# Altium footprint library sun_library.PcbLib: 412 footprints (part 13 of 26)
Each footprint in its own frame and in the unit in brackets; x right, y up, seen from the top. Pads: shape width x height; smd on the part's side, far side on the other; paste and mask are expansions set on the pad; w line width, h text height; cw(c..) or ccw(c..) is an arc to the next point about the centre after c.
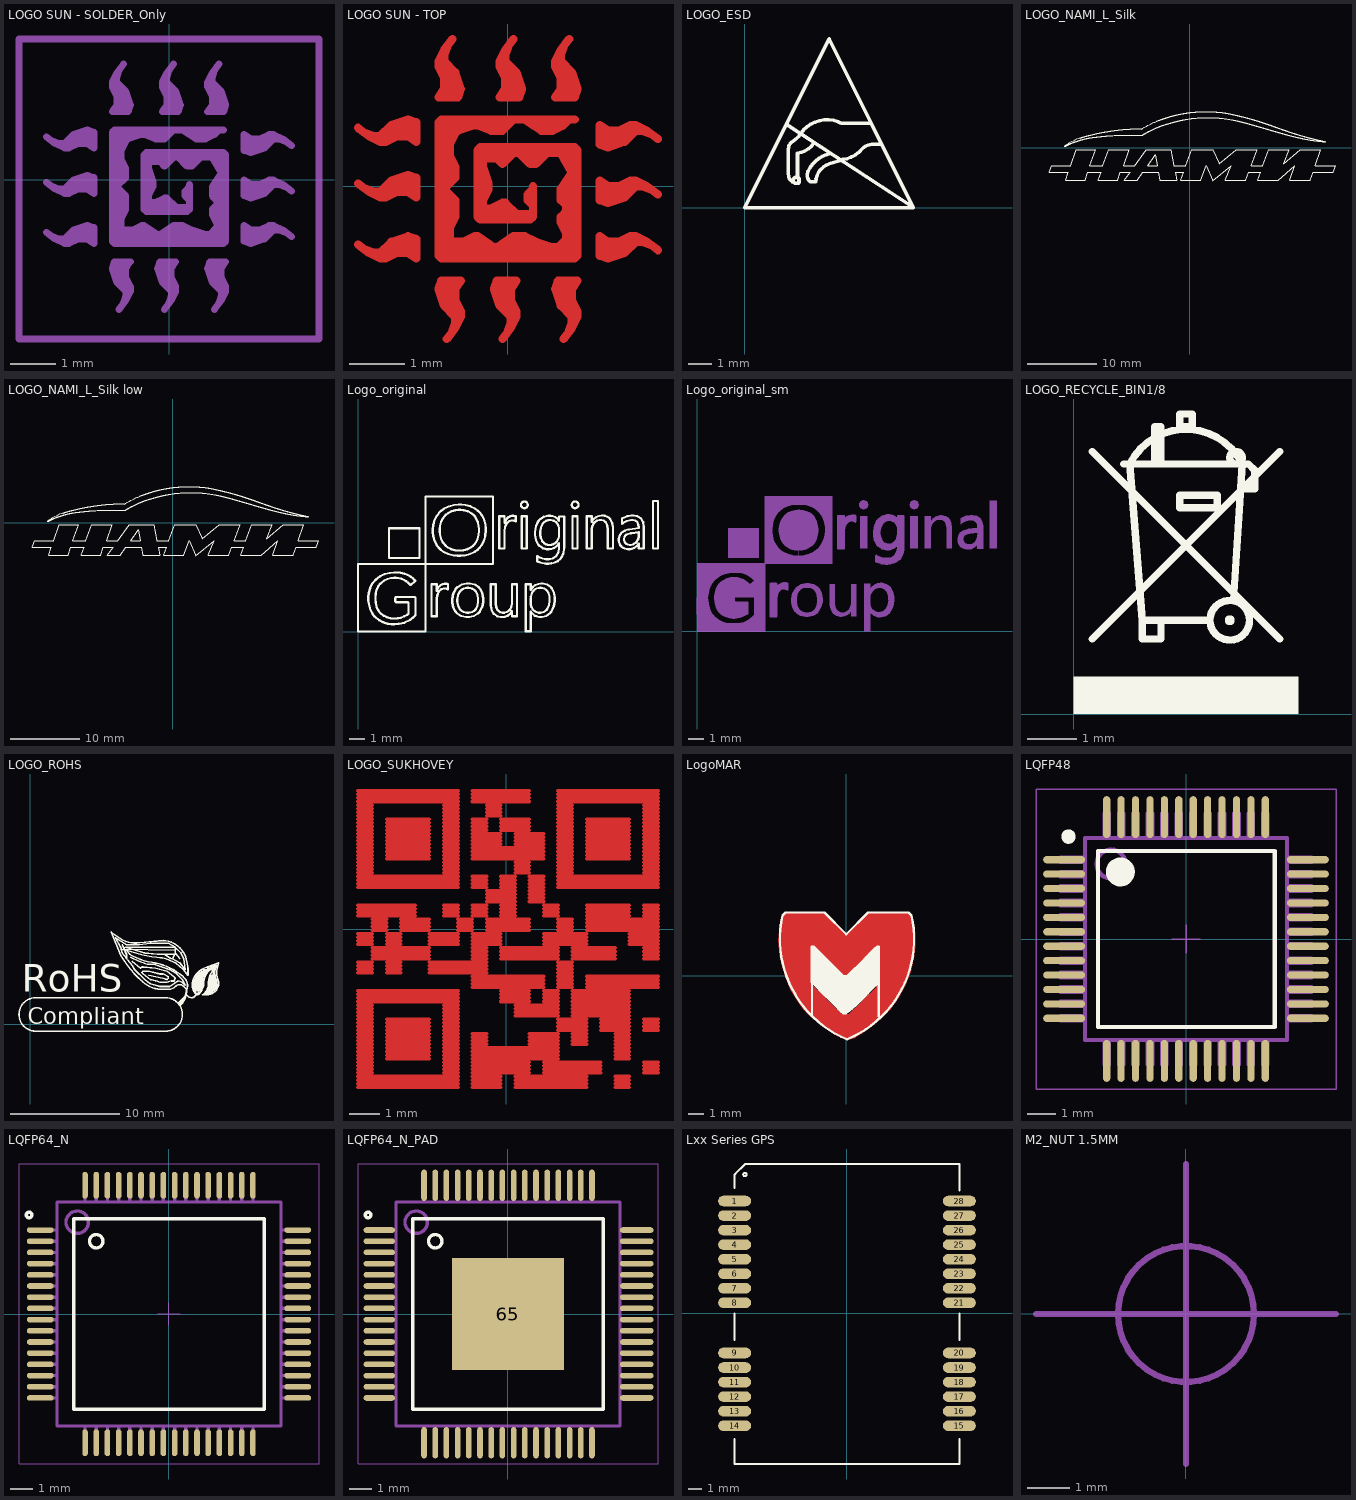
[diagram p12: the footprints below, top view; thin cyan lines are the x and y axes]

## LOGO SUN - SOLDER_Only [mm]
Top Solder:
  drawing of 670 lines, arcs and shapes, not listed

## LOGO SUN - TOP [mm]
Top:
  lines w0.15: -2.5,-1.2 -2.7,-1.05 -2.5,-1.2 ; -2.5,-1.2 -2.3,-1.3 ; -2.5,-1.2 -2.3,-1.3 ; -2.5,-0.1 -2.7,0.05 -2.5,-0.1 ; -2.5,-0.1 -2.3,-0.2 ; -2.5,-0.1 -2.3,-0.2 ; -2.5,0.9 -2.7,1.05 -2.5,0.9 ; -2.5,0.9 -2.3,0.8 ; -2.5,0.9 -2.3,0.8 ; -2.4,-1.2 -2.3,-1.2 ; -2.4,-1.2 -2.55,-1.15 -2.4,-1.2 ; -2.4,-1.2 -2.3,-1.2 ; -2.4,-0.1 -2.3,-0.1 ; -2.4,-0.1 -2.55,-0.05 -2.4,-0.1 ; -2.4,-0.1 -2.3,-0.1 ; -2.4,0.9 -2.3,0.9 ; -2.4,0.9 -2.55,0.95 -2.4,0.9 ; -2.4,0.9 -2.3,0.9 ; -2.3,-1.3 -2.2,-1.3 ; -2.3,-1.3 -2.2,-1.3 ; -2.3,-1.2 -2.1,-1 ; -2.3,-1.2 -2.1,-1 ; -2.3,-1.2 -2.15,-1.2 ; -2.3,-1.2 -2.15,-1.2 ; -2.3,-0.2 -2.2,-0.2 ; -2.3,-0.2 -2.2,-0.2 ; -2.3,-0.1 -2.15,-0.1 ; -2.3,-0.1 -2.1,0.1 ; -2.3,-0.1 -2.1,0.1 ; -2.3,-0.1 -2.15,-0.1 ; -2.3,0.8 -2.2,0.8 ; -2.3,0.8 -2.2,0.8 ; -2.3,0.9 -2.1,1.1 ; -2.3,0.9 -2.1,1.1 ; -2.3,0.9 -2.15,0.9 ; -2.3,0.9 -2.15,0.9 ; -2.2,-1.3 -2,-1.2 ; -2.2,-1.3 -2,-1.2 ; -2.2,-0.2 -2,-0.1 ; -2.2,-0.2 -2,-0.1 ; -2.2,0.8 -2,0.9 ; -2.2,0.8 -2,0.9 ; -2.15,-1.2 -2,-1.1 ; -2.15,-1.2 -2,-1.1 ; -2.15,-0.1 -2,0 ; -2.15,-0.1 -2,0 ; -2.15,0.9 -2,1 ; -2.15,0.9 -2,1 ; -2.1,-1 -1.8,-0.9 ; -2.1,-1 -1.8,-0.9 ; -2.1,0.1 -1.8,0.2 ; -2.1,0.1 -1.8,0.2 ; -2.1,1.1 -1.8,1.2 ; -2.1,1.1 -1.8,1.2 ; -2.05,-1.05 -1.9,-1.025 -2.05,-1.05 ; -2.05,-1.05 -2.2,-1.2 -2.05,-1.05 ; -2.05,0.05 -2.2,-0.1 -2.05,0.05 ; -2.05,0.05 -1.9,0.075 -2.05,0.05 ; -2.05,1.05 -2.2,0.9 -2.05,1.05 ; -2.05,1.05 -1.9,1.075 -2.05,1.05 ; -2,-1.2 -1.8,-1.2 ; -2,-1.2 -1.8,-1.2 ; -2,-1.1 -1.8,-1.1 ; -2,-1.1 -1.8,-1.1 ; -2,-0.1 -1.8,-0.1 ; -2,-0.1 -1.8,-0.1 ; -2,0 -1.8,0 ; -2,0 -1.8,0 ; -2,0.9 -1.8,0.9 ; -2,0.9 -1.8,0.9 ; -2,1 -1.8,1 ; -2,1 -1.8,1 ; -1.8,-1.2 -1.65,-1.3 ; -1.8,-1.2 -1.65,-1.3 ; -1.8,-1.1 -1.75,-1.2 ; -1.8,-1.1 -1.75,-1.2 ; -1.8,-0.9 -1.65,-0.95 ; -1.8,-0.9 -1.65,-0.95 ; -1.8,-0.1 -1.65,-0.2 ; -1.8,-0.1 -1.65,-0.2 ; -1.8,0 -1.75,-0.1 ; -1.8,0 -1.75,-0.1 ; -1.8,0.2 -1.65,0.15 ; -1.8,0.2 -1.65,0.15 ; -1.8,0.9 -1.65,0.8 ; -1.8,0.9 -1.65,0.8 ; -1.8,1 -1.75,0.9 ; -1.8,1 -1.75,0.9 ; -1.8,1.2 -1.65,1.15 ; -1.8,1.2 -1.65,1.15 ; -1.75,-1.2 -1.75,-1 ; -1.75,-1.2 -1.75,-1 ; -1.75,-1 -1.85,-1 -1.75,-1 ; -1.75,-0.1 -1.75,0.1 ; -1.75,-0.1 -1.75,0.1 ; -1.75,0.1 -1.85,0.1 -1.75,0.1 ; -1.75,0.9 -1.75,1.1 ; -1.75,0.9 -1.75,1.1 ; -1.75,1.1 -1.85,1.1 -1.75,1.1 ; -1.65,-1.3 -1.65,-0.95 ; -1.65,-1.3 -1.65,-0.95 ; -1.65,-0.2 -1.65,0.15 ; -1.65,-0.2 -1.65,0.15 ; -1.65,0.8 -1.65,1.15 ; -1.65,0.8 -1.65,1.15 ; -1.25,-1.85 -1.15,-2.15 ; -1.25,-1.85 -1.2,-1.7 ; -1.25,-1.85 -1.2,-1.7 ; -1.25,-1.85 -1.15,-2.15 ; -1.25,-1.25 -1.25,1.15 ; -1.25,-1.25 -1.25,1.15 ; -1.25,-1.25 -1.2,-1.3 ; -1.25,-1.25 -1.2,-1.3 ; -1.25,1.15 -1.2,1.2 ; -1.25,1.15 -1.2,1.2 ; -1.25,1.6 -1.15,1.75 ; -1.25,1.6 -1.15,1.75 ; -1.25,1.6 -0.9,1.6 ; -1.25,1.6 -0.9,1.6 ; -1.25,2.15 -1.25,2.25 ; -1.25,2.15 -1.15,1.95 ; -1.25,2.15 -1.15,1.95 ; -1.25,2.15 -1.25,2.25 ; -1.25,2.25 -1.15,2.45 ; -1.25,2.25 -1.15,2.45 ; -1.2,-1.7 -0.85,-1.7 ; -1.2,-1.7 -0.85,-1.7 ; -1.2,-1.3 1.2,-1.3 ; -1.2,-1.3 1.2,-1.3 ; -1.2,1.2 1.2,1.2 -1.2,1.2 ; -1.15,-2.15 -0.95,-2.35 ; -1.15,-2.15 -0.95,-2.35 ; -1.15,-1.8 -1.15,-1.9 -1.15,-1.8 ; -1.15,-1.8 -0.95,-1.8 ; -1.15,-1.8 -0.95,-1.8 ; -1.15,-1.2 -1.15,1.05 -1.15,-1.2 ; -1.15,-1.2 -1.15,-1.25 -1.15,-1.2 ; -1.15,-0.05 -0.95,-0.25 ; -1.15,-0.05 -0.95,0.15 ; -1.15,-0.05 -0.95,0.15 ; -1.15,-0.05 -0.95,-0.25 ; -1.15,1.7 -1.05,1.75 ; -1.15,1.7 -1.05,1.75 ; -1.15,1.7 -0.95,1.7 ; -1.15,1.7 -0.95,1.7 ; -1.15,1.75 -1.15,1.95 ; -1.15,1.75 -1.15,1.95 ; -1.15,2.1 -1.05,1.95 ; -1.15,2.1 -1.15,2.25 ; -1.15,2.1 -1.15,2.25 ; -1.15,2.1 -1.05,1.95 ; -1.15,2.25 -1.15,2.35 ; -1.15,2.25 -1.15,2.35 ; -1.15,2.25 -0.95,2.05 ; -1.15,2.25 -0.95,2.05 ; -1.15,2.35 -1.1,2.5 -1.15,2.35 ; -1.15,2.45 -1,2.65 -1.15,2.45 ; -1.1,-2.1 -1.125,-1.95 -1.1,-2.1 ; -1.1,-2.1 -0.95,-2.25 -1.1,-2.1 ; -1.05,-2.05 -1.05,-1.85 ; -1.05,-2.05 -1.05,-1.85 ; -1.05,-2.05 -0.95,-2.2 ; -1.05,-2.05 -0.95,-2.2 ; -1.05,-1.85 -0.95,-1.8 ; -1.05,-1.85 -0.95,-1.8 ; -1.05,1.75 -1.05,1.95 ; -1.05,1.75 -1.05,1.95 ; -1,-1 -0.8,-1 ; -1,-1 -0.8,-1 ; -1,-1 -1.1,-1 -1,-1 ; -1,2 -1.15,2.15 -1,2 ; -1,2 -0.975,1.85 -1,2 ; -0.95,-2.55 -0.85,-2.35 ; -0.95,-2.55 -0.85,-2.35 ; -0.95,-2.55 -1.1,-2.75 -0.95,-2.55 ; -0.95,-2.45 -1,-2.6 -0.95,-2.45 ; -0.95,-2.45 -0.95,-2.35 ; -0.95,-2.45 -0.95,-2.35 ; -0.95,-2.35 -0.95,-2.2 ; -0.95,-2.35 -0.95,-2.2 ; -0.95,-2.05 -0.85,-2.25 ; -0.95,-2.05 -0.85,-2.25 ; -0.95,-2.05 -0.95,-1.85 ; -0.95,-2.05 -0.95,-1.85 ; -0.95,-1.85 -0.85,-1.7 ; -0.95,-1.85 -0.85,-1.7 ; -0.95,-0.55 -1.05,-0.75 -0.95,-0.55 ; -0.95,-0.55 -0.95,-0.25 ; -0.95,-0.55 -0.95,-0.25 ; -0.95,0.15 -0.95,0.35 ; -0.95,0.15 -0.95,0.35 ; -0.95,0.35 -1.05,0.55 -0.95,0.35 ; -0.95,1.7 -0.95,1.8 -0.95,1.7 ; -0.95,2.05 -0.85,1.75 ; -0.95,2.05 -0.85,1.75 ; -0.9,1 -0.6,1.1 -0.9,1 ; -0.9,1 -1,1 -0.9,1 ; -0.9,1.6 -0.85,1.75 ; -0.9,1.6 -0.85,1.75 ; -0.85,-2.35 -0.85,-2.25 ; -0.85,-2.35 -0.85,-2.25 ; -0.8,-1 -0.4,-1 -0.8,-1 ; -0.8,-1 -0.6,-0.9 -0.8,-1 ; -0.55,-0.55 -0.5,-0.6 ; -0.55,-0.55 -0.5,-0.6 ; -0.55,-0.55 -0.55,0.65 ; -0.55,-0.55 -0.55,0.65 ; -0.55,0.65 -0.5,0.7 ; -0.55,0.65 -0.5,0.7 ; -0.5,-0.6 0.4,-0.6 ; -0.5,-0.6 0.4,-0.6 ; -0.5,0.7 1.2,0.7 ; -0.5,0.7 1.2,0.7 ; -0.45,-0.4 -0.3,-0.4 ; -0.45,-0.4 -0.45,-0.25 ; -0.45,-0.4 -0.45,-0.25 ; -0.45,-0.4 -0.3,-0.4 ; -0.45,-0.25 -0.35,-0.05 ; -0.45,-0.25 -0.35,-0.05 ; -0.45,0.35 -0.45,0.5 ; -0.45,0.35 -0.35,0.05 ; -0.45,0.35 -0.35,0.05 ; -0.45,0.35 -0.45,0.5 ; -0.45,0.5 -0.2,0.5 ; -0.45,0.5 -0.2,0.5 ; -0.35,-0.05 -0.35,0.05 ; -0.35,-0.05 -0.35,0.05 ; -0.3,-0.4 0.05,-0.4 -0.3,-0.4 ; -0.3,-0.4 -0.1,-0.3 ; -0.3,-0.4 -0.1,-0.3 ; -0.3,1 -0.55,1.1 -0.3,1 ; -0.3,1 -0.1,1 ; -0.3,1 -0.1,1 ; -0.25,-1.85 -0.15,-2.15 ; -0.25,-1.85 -0.2,-1.7 ; -0.25,-1.85 -0.2,-1.7 ; -0.25,-1.85 -0.15,-2.15 ; -0.2,-1.7 0.15,-1.7 ; -0.2,-1.7 0.15,-1.7 ; -0.2,-1.1 0.1,-0.9 ; -0.2,-1.1 0.1,-0.9 ; -0.2,-1.1 -0.3,-1.1 -0.2,-1.1 ; -0.2,0.5 -0.1,0.4 ; -0.2,0.5 0,0.5 -0.2,0.5 ; -0.2,0.5 -0.1,0.4 ; -0.15,-2.15 0.05,-2.35 ; -0.15,-2.15 0.05,-2.35 ; -0.15,-1.8 -0.15,-1.9 -0.15,-1.8 ; -0.15,-1.8 0.05,-1.8 ; -0.15,-1.8 0.05,-1.8 ; -0.15,1.6 -0.05,1.75 ; -0.15,1.6 0.2,1.6 ; -0.15,1.6 0.2,1.6 ; -0.15,1.6 -0.05,1.75 ; -0.15,2.15 -0.05,1.95 ; -0.15,2.15 -0.15,2.25 ; -0.15,2.15 -0.15,2.25 ; -0.15,2.15 -0.05,1.95 ; -0.15,2.25 -0.05,2.45 ; -0.15,2.25 -0.05,2.45 ; -0.1,-2.1 0.05,-2.25 -0.1,-2.1 ; -0.1,-2.1 -0.125,-1.95 -0.1,-2.1 ; -0.1,-0.3 -0.05,-0.3 ; -0.1,-0.3 -0.05,-0.3 ; -0.1,0.4 0.05,0.55 ; -0.1,0.4 0.05,0.55 ; -0.1,1 0.1,1.2 -0.1,1 ; -0.05,-2.05 0.05,-2.2 ; -0.05,-2.05 -0.05,-1.85 ; -0.05,-2.05 -0.05,-1.85 ; -0.05,-2.05 0.05,-2.2 ; -0.05,-1.85 0.05,-1.8 ; -0.05,-1.85 0.05,-1.8 ; -0.05,-0.3 0.15,-0.5 ; -0.05,-0.3 0.15,-0.5 ; -0.05,1.7 0.05,1.75 ; -0.05,1.7 0.15,1.7 ; -0.05,1.7 0.15,1.7 ; -0.05,1.7 0.05,1.75 ; -0.05,1.75 -0.05,1.95 ; -0.05,1.75 -0.05,1.95 ; -0.05,2.1 -0.05,2.25 ; -0.05,2.1 0.05,1.95 ; -0.05,2.1 0.05,1.95 ; -0.05,2.1 -0.05,2.25 ; -0.05,2.25 -0.05,2.35 ; -0.05,2.25 0.15,2.05 ; -0.05,2.25 0.15,2.05 ; -0.05,2.25 -0.05,2.35 ; -0.05,2.35 0,2.5 -0.05,2.35 ; -0.05,2.45 0.1,2.65 -0.05,2.45 ; 0.05,-2.55 -0.1,-2.75 0.05,-2.55 ; 0.05,-2.55 0.15,-2.35 ; 0.05,-2.55 0.15,-2.35 ; 0.05,-2.45 0.05,-2.35 ; 0.05,-2.45 0,-2.6 0.05,-2.45 ; 0.05,-2.45 0.05,-2.35 ; 0.05,-2.35 0.05,-2.2 ; 0.05,-2.35 0.05,-2.2 ; 0.05,-2.05 0.15,-2.25 ; 0.05,-2.05 0.05,-1.85 ; 0.05,-2.05 0.05,-1.85 ; 0.05,-2.05 0.15,-2.25 ; 0.05,-1.85 0.15,-1.7 ; 0.05,-1.85 0.15,-1.7 ; 0.05,0.55 0.1,0.6 ; 0.05,0.55 0.1,0.6 ; 0.05,1.75 0.05,1.95 ; 0.05,1.75 0.05,1.95 ; 0.1,-0.9 0.3,-0.9 ; 0.1,-0.9 0.3,-0.9 ; 0.1,0.6 0.2,0.6 ; 0.1,0.6 0.2,0.6 ; 0.1,2 -0.05,2.15 0.1,2 ; 0.1,2 0.125,1.85 0.1,2 ; 0.15,-2.35 0.15,-2.25 ; 0.15,-2.35 0.15,-2.25 ; 0.15,-0.5 -0.4,-0.5 0.15,-0.5 ; 0.15,-0.5 0.45,-0.5 0.15,-0.5 ; 0.15,1.7 0.15,1.8 0.15,1.7 ; 0.15,2.05 0.25,1.75 ; 0.15,2.05 0.25,1.75 ; 0.2,0.6 0.4,0.4 ; 0.2,0.6 0.4,0.4 ; 0.2,1.6 0.25,1.75 ; 0.2,1.6 0.25,1.75 ; 0.3,-0.9 0.5,-1 ; 0.3,-0.9 0.5,-1 ; 0.35,-0.25 0.35,-0.15 ; 0.35,-0.25 0.45,-0.35 0.35,-0.25 ; 0.35,-0.25 0.35,-0.15 ; 0.35,-0.15 0.45,-0.05 0.35,-0.15 ; 0.4,-0.6 0.45,-0.55 ; 0.4,-0.6 0.45,-0.55 ; 0.4,0.4 0.5,0.4 ; 0.4,0.4 0.5,0.4 ; 0.45,-0.55 0.45,0 0.45,-0.55 ; 0.5,-1 0.8,-1.1 ; 0.5,-1 -0.05,-1 0.5,-1 ; 0.5,-1 0.8,-1.1 ; 0.5,0.4 0.7,0.6 ; 0.5,0.4 0.7,0.6 ; 0.6,1 0.8,1 ; 0.6,1 0.3,1.2 0.6,1 ; 0.6,1 0.8,1 ; 0.7,0.6 0.95,0.6 ; 0.7,0.6 0.95,0.6 ; 0.8,-1.1 0.9,-1.1 ; 0.8,-1.1 0.9,-1.1 ; 0.8,1 1,1.1 ; 0.8,1 1,1.1 ; 0.85,-1.85 0.95,-2.15 ; 0.85,-1.85 0.9,-1.7 ; 0.85,-1.85 0.9,-1.7 ; 0.85,-1.85 0.95,-2.15 ; 0.85,1.6 1.2,1.6 ; 0.85,1.6 1.2,1.6 ; 0.85,1.6 0.95,1.75 ; 0.85,1.6 0.95,1.75 ; 0.85,2.15 0.95,1.95 ; 0.85,2.15 0.85,2.25 ; 0.85,2.15 0.85,2.25 ; 0.85,2.15 0.95,1.95 ; 0.85,2.25 0.95,2.45 ; 0.85,2.25 0.95,2.45 ; 0.9,-1.7 1.25,-1.7 ; 0.9,-1.7 1.25,-1.7 ; 0.9,-1.1 1.05,-0.95 ; 0.9,-1.1 1.05,-0.95 ; 0.95,-2.15 1.15,-2.35 ; 0.95,-2.15 1.15,-2.35 ; 0.95,-1.8 0.95,-1.9 0.95,-1.8 ; 0.95,-1.8 1.15,-1.8 ; 0.95,-1.8 1.15,-1.8 ; 0.95,-0.65 0.95,-0.55 ; 0.95,-0.65 0.95,-0.55 ; 0.95,-0.65 1.05,-0.85 ; 0.95,-0.65 1.05,-0.85 ; 0.95,-0.55 1.05,-0.45 ; 0.95,-0.55 1.05,-0.45 ; 0.95,-0.25 0.95,-0.05 ; 0.95,-0.25 0.95,-0.05 ; 0.95,-0.25 1.05,-0.35 ; 0.95,-0.25 1.05,-0.35 ; 0.95,-0.05 1.15,0.25 ; 0.95,-0.05 1.15,0.25 ; 0.95,0.6 1.15,0.25 ; 0.95,0.6 1.15,0.25 ; 0.95,1.7 1.05,1.75 ; 0.95,1.7 1.15,1.7 ; 0.95,1.7 1.15,1.7 ; 0.95,1.7 1.05,1.75 ; 0.95,1.75 0.95,1.95 ; 0.95,1.75 0.95,1.95 ; 0.95,2.1 0.95,2.25 ; 0.95,2.1 0.95,2.25 ; 0.95,2.1 1.05,1.95 ; 0.95,2.1 1.05,1.95 ; 0.95,2.25 0.95,2.35 ; 0.95,2.25 0.95,2.35 ; 0.95,2.25 1.15,2.05 ; 0.95,2.25 1.15,2.05 ; 0.95,2.35 1,2.5 0.95,2.35 ; 0.95,2.45 1.1,2.65 0.95,2.45 ; 1,-2.1 0.975,-1.95 1,-2.1 ; 1,-2.1 1.15,-2.25 1,-2.1 ; 1,1.1 0.45,1.1 1,1.1 ; 1,1.1 1.1,1.2 1,1.1 ; 1.05,-2.05 1.15,-2.2 ; 1.05,-2.05 1.05,-1.85 ; 1.05,-2.05 1.05,-1.85 ; 1.05,-2.05 1.15,-2.2 ; 1.05,-1.85 1.15,-1.8 ; 1.05,-1.85 1.15,-1.8 ; 1.05,-0.95 1.05,-0.85 ; 1.05,-0.95 1.05,-0.85 ; 1.05,-0.45 1.05,-0.35 ; 1.05,-0.45 1.05,-0.35 ; 1.05,1.75 1.05,1.95 ; 1.05,1.75 1.05,1.95 ; 1.1,2 0.95,2.15 1.1,2 ; 1.1,2 1.125,1.85 1.1,2 ; 1.15,-2.55 1.25,-2.35 ; 1.15,-2.55 1.25,-2.35 ; 1.15,-2.55 1,-2.75 1.15,-2.55 ; 1.15,-2.45 1.15,-2.35 ; 1.15,-2.45 1.15,-2.35 ; 1.15,-2.45 1.1,-2.6 1.15,-2.45 ; 1.15,-2.35 1.15,-2.2 ; 1.15,-2.35 1.15,-2.2 ; 1.15,-2.05 1.25,-2.25 ; 1.15,-2.05 1.25,-2.25 ; 1.15,-2.05 1.15,-1.85 ; 1.15,-2.05 1.15,-1.85 ; 1.15,-1.85 1.25,-1.7 ; 1.15,-1.85 1.25,-1.7 ; 1.15,1.7 1.15,1.8 1.15,1.7 ; 1.15,2.05 1.25,1.75 ; 1.15,2.05 1.25,1.75 ; 1.2,-1.3 1.25,-1.25 ; 1.2,-1.3 1.25,-1.25 ; 1.2,0.7 1.25,0.65 ; 1.2,0.7 1.25,0.65 ; 1.2,1.6 1.25,1.75 ; 1.2,1.6 1.25,1.75 ; 1.25,-2.35 1.25,-2.25 ; 1.25,-2.35 1.25,-2.25 ; 1.25,-1.25 1.25,0.65 ; 1.25,-1.25 1.25,0.65 ; 1.65,-1.25 1.65,-0.9 ; 1.65,-1.25 1.65,-0.9 ; 1.65,-1.25 1.8,-1.3 ; 1.65,-1.25 1.8,-1.3 ; 1.65,-0.9 1.8,-1 ; 1.65,-0.9 1.8,-1 ; 1.65,-0.25 1.8,-0.3 ; 1.65,-0.25 1.65,0.1 ; 1.65,-0.25 1.65,0.1 ; 1.65,-0.25 1.8,-0.3 ; 1.65,0.1 1.8,0 ; 1.65,0.1 1.8,0 ; 1.65,0.75 1.65,1.1 ; 1.65,0.75 1.65,1.1 ; 1.65,0.75 1.8,0.7 ; 1.65,0.75 1.8,0.7 ; 1.65,1.1 1.8,1 ; 1.65,1.1 1.8,1 ; 1.75,-1.2 1.75,-1 ; 1.75,-1.2 1.75,-1 ; 1.75,-1.2 1.85,-1.2 1.75,-1.2 ; 1.75,-1 1.8,-1.1 ; 1.75,-1 1.8,-1.1 ; 1.75,-0.2 1.75,0 ; 1.75,-0.2 1.85,-0.2 1.75,-0.2 ; 1.75,-0.2 1.75,0 ; 1.75,0 1.8,-0.1 ; 1.75,0 1.8,-0.1 ; 1.75,0.8 1.75,1 ; 1.75,0.8 1.75,1 ; 1.75,0.8 1.85,0.8 1.75,0.8 ; 1.75,1 1.8,0.9 ; 1.75,1 1.8,0.9 ; 1.8,-1.3 2.1,-1.2 ; 1.8,-1.3 2.1,-1.2 ; 1.8,-1.1 2,-1.1 ; 1.8,-1.1 2,-1.1 ; 1.8,-1 2,-1 ; 1.8,-1 2,-1 ; 1.8,-0.3 2.1,-0.2 ; 1.8,-0.3 2.1,-0.2 ; 1.8,-0.1 2,-0.1 ; 1.8,-0.1 2,-0.1 ; 1.8,0 2,0 ; 1.8,0 2,0 ; 1.8,0.7 2.1,0.8 ; 1.8,0.7 2.1,0.8 ; 1.8,0.9 2,0.9 ; 1.8,0.9 2,0.9 ; 1.8,1 2,1 ; 1.8,1 2,1 ; 2,-1.1 2.15,-1 ; 2,-1.1 2.15,-1 ; 2,-1 2.2,-0.9 ; 2,-1 2.2,-0.9 ; 2,-0.1 2.15,0 ; 2,-0.1 2.15,0 ; 2,0 2.2,0.1 ; 2,0 2.2,0.1 ; 2,0.9 2.15,1 ; 2,0.9 2.15,1 ; 2,1 2.2,1.1 ; 2,1 2.2,1.1 ; 2.05,-1.15 2.2,-1 2.05,-1.15 ; 2.05,-1.15 1.9,-1.175 2.05,-1.15 ; 2.05,-0.15 1.9,-0.175 2.05,-0.15 ; 2.05,-0.15 2.2,0 2.05,-0.15 ; 2.05,0.85 2.2,1 2.05,0.85 ; 2.05,0.85 1.9,0.825 2.05,0.85 ; 2.1,-1.2 2.3,-1 ; 2.1,-1.2 2.3,-1 ; 2.1,-0.2 2.3,0 ; 2.1,-0.2 2.3,0 ; 2.1,0.8 2.3,1 ; 2.1,0.8 2.3,1 ; 2.15,-1 2.3,-1 ; 2.15,-1 2.3,-1 ; 2.15,0 2.3,0 ; 2.15,0 2.3,0 ; 2.15,1 2.3,1 ; 2.15,1 2.3,1 ; 2.2,-0.9 2.3,-0.9 ; 2.2,-0.9 2.3,-0.9 ; 2.2,0.1 2.3,0.1 ; 2.2,0.1 2.3,0.1 ; 2.2,1.1 2.3,1.1 ; 2.2,1.1 2.3,1.1 ; 2.3,-1 2.4,-1 ; 2.3,-1 2.4,-1 ; 2.3,-0.9 2.5,-1 ; 2.3,-0.9 2.5,-1 ; 2.3,0 2.4,0 ; 2.3,0 2.4,0 ; 2.3,0.1 2.5,0 ; 2.3,0.1 2.5,0 ; 2.3,1 2.4,1 ; 2.3,1 2.4,1 ; 2.3,1.1 2.5,1 ; 2.3,1.1 2.5,1 ; 2.4,-1 2.55,-1.05 2.4,-1 ; 2.4,0 2.55,-0.05 2.4,0 ; 2.4,1 2.55,0.95 2.4,1 ; 2.5,-1 2.7,-1.15 2.5,-1 ; 2.5,0 2.7,-0.15 2.5,0 ; 2.5,1 2.7,0.85 2.5,1 ; -1.2,1.1 0,1.1 -1.2,1.1 ; -1.1,-1.2 1.2,-1.2 -1.1,-1.2 ; -1.1,-1.1 1,-1.1 -1.1,-1.1 ; -1.05,-1 -1.05,-0.15 -1.05,-1 ; -1.05,0.05 -1.05,1.05 -1.05,0.05 ; -1.05,0.75 -0.95,0.95 -1.05,0.75 ; -0.65,-0.95 -0.5,-0.95 -0.65,-0.95 ; -0.55,-0.9 -0.25,-1.1 -0.55,-0.9 ; -0.5,0.6 1.1,0.6 -0.5,0.6 ; -0.45,-0.55 -0.45,0.55 -0.45,-0.55 ; 0.3,0.5 0.6,0.5 0.3,0.5 ; 1.05,-1.15 1.05,0.1 1.05,-1.15 ; 1.05,0.45 1.05,0.6 1.05,0.45 ; 1.15,-1.15 1.15,0.65 1.15,-1.15

## LOGO_ESD [mm]
Top Overlay:
  lines w0.15: 1.778,3.492 7.112,0 ; 2.032,1.143 cw(c2.159,1.143) 2.159,1.27 2.222,1.27 ; 2.921,2.73 cw(c2.072,3.293) 2.223,2.286 2.222,1.27 ; 2.946,1.079 2.794,1.079 cw(c2.857,1.27) 2.667,1.207 cw(c2.985,1.365) 2.667,1.524 cw(c3.905,0.953) 3.62,2.286 ; 2.984,1.079 cw(c3.841,1.032) 3.556,1.841 cw(c4.821,-1.745) 4.001,1.968 ; 4.128,2.032 ccw(c3.985,3.286) 4.953,2.476 cw(c5.397,2.063) 5.461,2.667 5.779,2.667 ; 2.222,1.27 cw(c2.222,1.206) 2.286,1.206 2.286,1.079 cw(c2.223,1.079) 2.223,1.016 cw(c2.222,1.397) 1.841,1.397 1.841,2.476 cw(c2.201,2.476) 2.032,2.794 ccw(c1.556,3.587) 2.35,3.112 cw(c3.47,2.345) 3.937,3.619 ccw(c4.122,3.849) 4.154,3.556 5.334,3.556 ; 5.334,3.556 3.556,7.112 0,0 7.112,0 ; 5.334,3.556 5.779,2.667 ; 5.779,2.667 7.112,0

## LOGO_NAMI_L_Silk [mm]
Top Overlay:
  drawing of 2491 lines, arcs and shapes, not listed

## LOGO_NAMI_L_Silk low [mm]
Top Overlay:
  drawing of 2491 lines, arcs and shapes, not listed

## Logo_original [mm]
Top Overlay:
  drawing of 744 lines, arcs and shapes, not listed

## Logo_original_sm [mm]
Top Solder:
  drawing of 16 lines, arcs and shapes, not listed

## LOGO_RECYCLE_BIN1/8 [mm]
Top Overlay:
  circle w0.15: c3.175,1.905 r0.025
  circle w0.15: c3.175,1.905 r0.402
  circle w0.15: c3.302,5.207 r0.127
  rectangle: 0,0 4.572,0.762
  lines w0.15: 0.381,1.524 3.429,4.572 ; 0.381,5.334 4.191,1.524 ; 1.016,5.08 1.143,5.08 ; 2.769,1.905 1.778,1.905 ; 3.251,2.311 3.429,5.08 ; 4.191,5.334 3.429,4.572 ; 1.143,5.08 cw(c2.286,4.508) 3.429,5.08 ; 1.143,5.08 1.397,1.905 ; 1.143,5.08 1.651,5.08 ; 1.397,1.905 1.778,1.905 ; 1.397,1.905 1.397,1.524 1.778,1.524 1.778,1.905 ; 1.651,5.08 1.778,5.08 ; 1.651,5.08 1.651,5.842 1.778,5.842 1.778,5.08 ; 1.778,5.08 3.429,5.08 ; 3.429,4.572 3.683,4.572 3.683,4.953 3.556,5.08 3.429,5.08 ; 2.159,4.191 2.159,4.445 2.921,4.445 2.921,4.191 2.159,4.191 ; 2.159,5.842 2.159,6.096 2.413,6.096 2.413,5.842 2.159,5.842

## LOGO_ROHS [mm]
Top Overlay:
  drawing of 189 lines, arcs and shapes, not listed
  text "Compliant" at -0.2,0 h1.5
  text "RoHS" at -0.75,2.95 h2.5

## LOGO_SUKHOVEY [mm]
Top:
  lines w0.119: -4.925,-5.25 -1.6,-5.25 ; -4.925,-5.131 -1.6,-5.131 ; -4.925,-5.012 -1.6,-5.012 ; -4.925,-4.893 -1.6,-4.893 ; -4.925,-4.775 -4.45,-4.775 ; -4.925,-4.656 -4.45,-4.656 ; -4.925,-4.537 -4.45,-4.537 ; -4.925,-4.419 -4.45,-4.419 ; -4.925,-4.3 -4.45,-4.3 ; -4.925,-4.181 -4.45,-4.181 ; -4.925,-4.062 -4.45,-4.062 ; -4.925,-3.944 -4.45,-3.944 ; -4.925,-3.825 -4.45,-3.825 ; -4.925,-3.706 -4.45,-3.706 ; -4.925,-3.587 -4.45,-3.587 ; -4.925,-3.469 -4.45,-3.469 ; -4.925,-3.35 -4.45,-3.35 ; -4.925,-3.231 -4.45,-3.231 ; -4.925,-3.112 -4.45,-3.112 ; -4.925,-2.994 -4.45,-2.994 ; -4.925,-2.875 -4.45,-2.875 ; -4.925,-2.756 -4.45,-2.756 ; -4.925,-2.637 -4.45,-2.637 ; -4.925,-2.519 -4.45,-2.519 ; -4.925,-2.4 -1.6,-2.4 ; -4.925,-2.281 -1.6,-2.281 ; -4.925,-2.162 -1.6,-2.162 ; -4.925,-2.044 -1.6,-2.044 ; -4.925,-1.45 -4.45,-1.45 ; -4.925,-1.331 -4.45,-1.331 ; -4.925,-1.212 -4.45,-1.212 ; -4.925,-1.094 -4.45,-1.094 ; -4.925,-0.5 -4.45,-0.5 ; -4.925,-0.381 -4.45,-0.381 ; -4.925,-0.263 -4.45,-0.263 ; -4.925,-0.144 -4.45,-0.144 ; -4.925,0.45 -3.025,0.45 ; -4.925,0.569 -3.025,0.569 ; -4.925,0.687 -3.025,0.687 ; -4.925,0.806 -3.025,0.806 ; -4.925,1.4 -1.6,1.4 ; -4.925,1.519 -1.6,1.519 ; -4.925,1.637 -1.6,1.637 ; -4.925,1.756 -1.6,1.756 ; -4.925,1.875 -4.45,1.875 ; -4.925,1.994 -4.45,1.994 ; -4.925,2.112 -4.45,2.112 ; -4.925,2.231 -4.45,2.231 ; -4.925,2.35 -4.45,2.35 ; -4.925,2.469 -4.45,2.469 ; -4.925,2.587 -4.45,2.587 ; -4.925,2.706 -4.45,2.706 ; -4.925,2.825 -4.45,2.825 ; -4.925,2.944 -4.45,2.944 ; -4.925,3.062 -4.45,3.062 ; -4.925,3.181 -4.45,3.181 ; -4.925,3.3 -4.45,3.3 ; -4.925,3.419 -4.45,3.419 ; -4.925,3.537 -4.45,3.537 ; -4.925,3.656 -4.45,3.656 ; -4.925,3.775 -4.45,3.775 ; -4.925,3.893 -4.45,3.893 ; -4.925,4.012 -4.45,4.012 ; -4.925,4.131 -4.45,4.131 ; -4.925,4.25 -1.6,4.25 ; -4.925,4.368 -1.6,4.368 ; -4.925,4.487 -1.6,4.487 ; -4.925,4.606 -1.6,4.606 ; -4.45,-0.975 -2.55,-0.975 ; -4.45,-0.856 -2.55,-0.856 ; -4.45,-0.737 -2.55,-0.737 ; -4.45,-0.619 -2.55,-0.619 ; -4.45,-0.025 -3.975,-0.025 ; -4.45,0.094 -3.975,0.094 ; -4.45,0.212 -3.975,0.212 ; -4.45,0.331 -3.975,0.331 ; -3.975,-4.3 -2.55,-4.3 ; -3.975,-4.181 -2.55,-4.181 ; -3.975,-4.062 -2.55,-4.062 ; -3.975,-3.944 -2.55,-3.944 ; -3.975,-3.825 -2.55,-3.825 ; -3.975,-3.706 -2.55,-3.706 ; -3.975,-3.587 -2.55,-3.587 ; -3.975,-3.469 -2.55,-3.469 ; -3.975,-3.35 -2.55,-3.35 ; -3.975,-3.231 -2.55,-3.231 ; -3.975,-3.112 -2.55,-3.112 ; -3.975,-2.994 -2.55,-2.994 ; -3.975,-1.45 -3.5,-1.45 ; -3.975,-1.331 -3.5,-1.331 ; -3.975,-1.212 -3.5,-1.212 ; -3.975,-1.094 -3.5,-1.094 ; -3.975,-0.5 -3.5,-0.5 ; -3.975,-0.381 -3.5,-0.381 ; -3.975,-0.263 -3.5,-0.263 ; -3.975,-0.144 -3.5,-0.144 ; -3.975,2.35 -2.55,2.35 ; -3.975,2.469 -2.55,2.469 ; -3.975,2.587 -2.55,2.587 ; -3.975,2.706 -2.55,2.706 ; -3.975,2.825 -2.55,2.825 ; -3.975,2.944 -2.55,2.944 ; -3.975,3.062 -2.55,3.062 ; -3.975,3.181 -2.55,3.181 ; -3.975,3.3 -2.55,3.3 ; -3.975,3.419 -2.55,3.419 ; -3.975,3.537 -2.55,3.537 ; -3.975,3.656 -2.55,3.656 ; -3.5,-0.025 -2.55,-0.025 ; -3.5,0.094 -2.55,0.094 ; -3.5,0.212 -2.55,0.212 ; -3.5,0.331 -2.55,0.331 ; -2.55,-1.45 -0.65,-1.45 ; -2.55,-1.331 -0.65,-1.331 ; -2.55,-1.212 -0.65,-1.212 ; -2.55,-1.094 -0.65,-1.094 ; -2.55,-0.5 -1.6,-0.5 ; -2.55,-0.381 -1.6,-0.381 ; -2.55,-0.263 -1.6,-0.263 ; -2.55,-0.144 -1.6,-0.144 ; -2.075,-4.775 -1.6,-4.775 ; -2.075,-4.656 -1.6,-4.656 ; -2.075,-4.537 -1.6,-4.537 ; -2.075,-4.419 -1.6,-4.419 ; -2.075,-4.3 -1.6,-4.3 ; -2.075,-4.181 -1.6,-4.181 ; -2.075,-4.062 -1.6,-4.062 ; -2.075,-3.944 -1.6,-3.944 ; -2.075,-3.825 -1.6,-3.825 ; -2.075,-3.706 -1.6,-3.706 ; -2.075,-3.587 -1.6,-3.587 ; -2.075,-3.469 -1.6,-3.469 ; -2.075,-3.35 -1.6,-3.35 ; -2.075,-3.231 -1.6,-3.231 ; -2.075,-3.112 -1.6,-3.112 ; -2.075,-2.994 -1.6,-2.994 ; -2.075,-2.875 -1.6,-2.875 ; -2.075,-2.756 -1.6,-2.756 ; -2.075,-2.637 -1.6,-2.637 ; -2.075,-2.519 -1.6,-2.519 ; -2.075,0.45 -1.6,0.45 ; -2.075,0.569 -1.6,0.569 ; -2.075,0.687 -1.6,0.687 ; -2.075,0.806 -1.6,0.806 ; -2.075,1.875 -1.6,1.875 ; -2.075,1.994 -1.6,1.994 ; -2.075,2.112 -1.6,2.112 ; -2.075,2.231 -1.6,2.231 ; -2.075,2.35 -1.6,2.35 ; -2.075,2.469 -1.6,2.469 ; -2.075,2.587 -1.6,2.587 ; -2.075,2.706 -1.6,2.706 ; -2.075,2.825 -1.6,2.825 ; -2.075,2.944 -1.6,2.944 ; -2.075,3.062 -1.6,3.062 ; -2.075,3.181 -1.6,3.181 ; -2.075,3.3 -1.6,3.3 ; -2.075,3.419 -1.6,3.419 ; -2.075,3.537 -1.6,3.537 ; -2.075,3.656 -1.6,3.656 ; -2.075,3.775 -1.6,3.775 ; -2.075,3.893 -1.6,3.893 ; -2.075,4.012 -1.6,4.012 ; -2.075,4.131 -1.6,4.131 ; -1.6,-0.025 -1.125,-0.025 ; -1.6,0.094 -1.125,0.094 ; -1.6,0.212 -1.125,0.212 ; -1.6,0.331 -1.125,0.331 ; -1.125,-5.25 -0.175,-5.25 ; -1.125,-5.131 -0.175,-5.131 ; -1.125,-5.012 -0.175,-5.012 ; -1.125,-4.893 -0.175,-4.893 ; -1.125,-4.775 0.775,-4.775 ; -1.125,-4.656 0.775,-4.656 ; -1.125,-4.537 0.775,-4.537 ; -1.125,-4.419 0.775,-4.419 ; -1.125,-4.3 1.725,-4.3 ; -1.125,-4.181 1.725,-4.181 ; -1.125,-4.062 1.725,-4.062 ; -1.125,-3.944 1.725,-3.944 ; -1.125,-3.825 -0.65,-3.825 ; -1.125,-3.706 -0.65,-3.706 ; -1.125,-3.587 -0.65,-3.587 ; -1.125,-3.469 -0.65,-3.469 ; -1.125,-1.925 1.25,-1.925 ; -1.125,-1.806 1.25,-1.806 ; -1.125,-1.687 1.25,-1.687 ; -1.125,-1.569 1.25,-1.569 ; -1.125,-0.975 -0.65,-0.975 ; -1.125,-0.856 -0.65,-0.856 ; -1.125,-0.737 -0.65,-0.737 ; -1.125,-0.619 -0.65,-0.619 ; -1.125,-0.5 -0.175,-0.5 ; -1.125,-0.381 -0.175,-0.381 ; -1.125,-0.263 -0.175,-0.263 ; -1.125,-0.144 -0.175,-0.144 ; -1.125,0.45 -0.65,0.45 ; -1.125,0.569 -0.65,0.569 ; -1.125,0.687 -0.65,0.687 ; -1.125,0.806 -0.65,0.806 ; -1.125,1.4 -0.65,1.4 ; -1.125,1.519 -0.65,1.519 ; -1.125,1.637 -0.65,1.637 ; -1.125,1.756 -0.65,1.756 ; -1.125,2.35 1.25,2.35 ; -1.125,2.469 1.25,2.469 ; -1.125,2.587 1.25,2.587 ; -1.125,2.706 1.25,2.706 ; -1.125,2.825 -0.175,2.825 ; -1.125,2.944 -0.175,2.944 ; -1.125,3.062 -0.175,3.062 ; -1.125,3.181 -0.175,3.181 ; -1.125,3.3 -0.65,3.3 ; -1.125,3.419 -0.65,3.419 ; -1.125,3.537 -0.65,3.537 ; -1.125,3.656 -0.65,3.656 ; -1.125,4.25 0.775,4.25 ; -1.125,4.368 0.775,4.368 ; -1.125,4.487 0.775,4.487 ; -1.125,4.606 0.775,4.606 ; -0.65,-0.025 0.775,-0.025 ; -0.65,0.094 0.775,0.094 ; -0.65,0.212 0.775,0.212 ; -0.65,0.331 0.775,0.331 ; -0.65,0.925 0.3,0.925 ; -0.65,1.044 0.3,1.044 ; -0.65,1.162 0.3,1.162 ; -0.65,1.281 0.3,1.281 ; -0.65,3.775 -0.175,3.775 ; -0.65,3.893 -0.175,3.893 ; -0.65,4.012 -0.175,4.012 ; -0.65,4.131 -0.175,4.131 ; -0.175,-2.4 0.775,-2.4 ; -0.175,-2.281 0.775,-2.281 ; -0.175,-2.162 0.775,-2.162 ; -0.175,-2.044 0.775,-2.044 ; -0.175,-0.975 1.725,-0.975 ; -0.175,-0.856 1.725,-0.856 ; -0.175,-0.737 1.725,-0.737 ; -0.175,-0.619 1.725,-0.619 ; -0.175,0.45 0.3,0.45 ; -0.175,0.569 0.3,0.569 ; -0.175,0.687 0.3,0.687 ; -0.175,0.806 0.3,0.806 ; -0.175,1.4 0.3,1.4 ; -0.175,1.519 0.3,1.519 ; -0.175,1.637 0.3,1.637 ; -0.175,1.756 0.3,1.756 ; -0.175,3.3 0.775,3.3 ; -0.175,3.419 0.775,3.419 ; -0.175,3.537 0.775,3.537 ; -0.175,3.656 0.775,3.656 ; 0.3,-5.25 2.675,-5.25 ; 0.3,-5.131 2.675,-5.131 ; 0.3,-5.012 2.675,-5.012 ; 0.3,-4.893 2.675,-4.893 ; 0.3,-2.875 1.725,-2.875 ; 0.3,-2.756 1.725,-2.756 ; 0.3,-2.637 1.725,-2.637 ; 0.3,-2.519 1.725,-2.519 ; 0.3,1.875 0.775,1.875 ; 0.3,1.994 0.775,1.994 ; 0.3,2.112 0.775,2.112 ; 0.3,2.231 0.775,2.231 ; 0.3,2.825 1.25,2.825 ; 0.3,2.944 1.25,2.944 ; 0.3,3.062 1.25,3.062 ; 0.3,3.181 1.25,3.181 ; 0.775,-3.825 1.725,-3.825 ; 0.775,-3.706 1.725,-3.706 ; 0.775,-3.587 1.725,-3.587 ; 0.775,-3.469 1.725,-3.469 ; 0.775,0.925 1.25,0.925 ; 0.775,1.044 1.25,1.044 ; 0.775,1.162 1.25,1.162 ; 0.775,1.281 1.25,1.281 ; 0.775,1.4 1.25,1.4 ; 0.775,1.519 1.25,1.519 ; 0.775,1.637 1.25,1.637 ; 0.775,1.756 1.25,1.756 ; 1.25,-4.775 3.15,-4.775 ; 1.25,-4.656 3.15,-4.656 ; 1.25,-4.537 3.15,-4.537 ; 1.25,-4.419 3.15,-4.419 ; 1.25,-2.4 1.725,-2.4 ; 1.25,-2.281 1.725,-2.281 ; 1.25,-2.162 1.725,-2.162 ; 1.25,-2.044 1.725,-2.044 ; 1.25,-0.5 2.675,-0.5 ; 1.25,-0.381 2.675,-0.381 ; 1.25,-0.263 2.675,-0.263 ; 1.25,-0.144 2.675,-0.144 ; 1.25,0.45 1.725,0.45 ; 1.25,0.569 1.725,0.569 ; 1.25,0.687 1.725,0.687 ; 1.25,0.806 1.725,0.806 ; 1.725,-3.35 2.675,-3.35 ; 1.725,-3.231 2.675,-3.231 ; 1.725,-3.112 2.675,-3.112 ; 1.725,-2.994 2.675,-2.994 ; 1.725,-1.925 2.2,-1.925 ; 1.725,-1.806 2.2,-1.806 ; 1.725,-1.687 2.2,-1.687 ; 1.725,-1.569 2.2,-1.569 ; 1.725,-1.45 2.2,-1.45 ; 1.725,-1.331 2.2,-1.331 ; 1.725,-1.212 2.2,-1.212 ; 1.725,-1.094 2.2,-1.094 ; 1.725,-0.025 2.2,-0.025 ; 1.725,0.094 2.2,0.094 ; 1.725,0.212 2.2,0.212 ; 1.725,0.331 2.2,0.331 ; 1.725,1.4 5.05,1.4 ; 1.725,1.519 5.05,1.519 ; 1.725,1.637 5.05,1.637 ; 1.725,1.756 5.05,1.756 ; 1.725,1.875 2.2,1.875 ; 1.725,1.994 2.2,1.994 ; 1.725,2.112 2.2,2.112 ; 1.725,2.231 2.2,2.231 ; 1.725,2.35 2.2,2.35 ; 1.725,2.469 2.2,2.469 ; 1.725,2.587 2.2,2.587 ; 1.725,2.706 2.2,2.706 ; 1.725,2.825 2.2,2.825 ; 1.725,2.944 2.2,2.944 ; 1.725,3.062 2.2,3.062 ; 1.725,3.181 2.2,3.181 ; 1.725,3.3 2.2,3.3 ; 1.725,3.419 2.2,3.419 ; 1.725,3.537 2.2,3.537 ; 1.725,3.656 2.2,3.656 ; 1.725,3.775 2.2,3.775 ; 1.725,3.893 2.2,3.893 ; 1.725,4.012 2.2,4.012 ; 1.725,4.131 2.2,4.131 ; 1.725,4.25 5.05,4.25 ; 1.725,4.368 5.05,4.368 ; 1.725,4.487 5.05,4.487 ; 1.725,4.606 5.05,4.606 ; 2.2,-3.825 2.675,-3.825 ; 2.2,-3.706 2.675,-3.706 ; 2.2,-3.587 2.675,-3.587 ; 2.2,-3.469 2.675,-3.469 ; 2.2,-2.875 4.1,-2.875 ; 2.2,-2.756 4.1,-2.756 ; 2.2,-2.637 4.1,-2.637 ; 2.2,-2.519 4.1,-2.519 ; 2.2,-2.4 4.1,-2.4 ; 2.2,-2.281 4.1,-2.281 ; 2.2,-2.162 4.1,-2.162 ; 2.2,-2.044 4.1,-2.044 ; 2.2,-0.975 3.625,-0.975 ; 2.2,-0.856 3.625,-0.856 ; 2.2,-0.737 3.625,-0.737 ; 2.2,-0.619 3.625,-0.619 ; 2.675,-1.925 5.05,-1.925 ; 2.675,-1.806 5.05,-1.806 ; 2.675,-1.687 5.05,-1.687 ; 2.675,-1.569 5.05,-1.569 ; 2.675,-0.025 5.05,-0.025 ; 2.675,0.094 5.05,0.094 ; 2.675,0.212 5.05,0.212 ; 2.675,0.331 5.05,0.331 ; 2.675,0.45 4.1,0.45 ; 2.675,0.569 4.1,0.569 ; 2.675,0.687 4.1,0.687 ; 2.675,0.806 4.1,0.806 ; 2.675,2.35 4.1,2.35 ; 2.675,2.469 4.1,2.469 ; 2.675,2.587 4.1,2.587 ; 2.675,2.706 4.1,2.706 ; 2.675,2.825 4.1,2.825 ; 2.675,2.944 4.1,2.944 ; 2.675,3.062 4.1,3.062 ; 2.675,3.181 4.1,3.181 ; 2.675,3.3 4.1,3.3 ; 2.675,3.419 4.1,3.419 ; 2.675,3.537 4.1,3.537 ; 2.675,3.656 4.1,3.656 ; 3.15,-3.35 4.1,-3.35 ; 3.15,-3.231 4.1,-3.231 ; 3.15,-3.112 4.1,-3.112 ; 3.15,-2.994 4.1,-2.994 ; 3.625,-5.25 4.1,-5.25 ; 3.625,-5.131 4.1,-5.131 ; 3.625,-5.012 4.1,-5.012 ; 3.625,-4.893 4.1,-4.893 ; 3.625,-4.3 4.1,-4.3 ; 3.625,-4.181 4.1,-4.181 ; 3.625,-4.062 4.1,-4.062 ; 3.625,-3.944 4.1,-3.944 ; 3.625,-3.825 4.1,-3.825 ; 3.625,-3.706 4.1,-3.706 ; 3.625,-3.587 4.1,-3.587 ; 3.625,-3.469 4.1,-3.469 ; 4.1,-0.5 5.05,-0.5 ; 4.1,-0.381 5.05,-0.381 ; 4.1,-0.263 5.05,-0.263 ; 4.1,-0.144 5.05,-0.144 ; 4.575,-4.775 5.05,-4.775 ; 4.575,-4.656 5.05,-4.656 ; 4.575,-4.537 5.05,-4.537 ; 4.575,-4.419 5.05,-4.419 ; 4.575,-3.35 5.05,-3.35 ; 4.575,-3.231 5.05,-3.231 ; 4.575,-3.112 5.05,-3.112 ; 4.575,-2.994 5.05,-2.994 ; 4.575,-0.975 5.05,-0.975 ; 4.575,-0.856 5.05,-0.856 ; 4.575,-0.737 5.05,-0.737 ; 4.575,-0.619 5.05,-0.619 ; 4.575,0.45 5.05,0.45 ; 4.575,0.569 5.05,0.569 ; 4.575,0.687 5.05,0.687 ; 4.575,0.806 5.05,0.806 ; 4.575,1.875 5.05,1.875 ; 4.575,1.994 5.05,1.994 ; 4.575,2.112 5.05,2.112 ; 4.575,2.231 5.05,2.231 ; 4.575,2.35 5.05,2.35 ; 4.575,2.469 5.05,2.469 ; 4.575,2.587 5.05,2.587 ; 4.575,2.706 5.05,2.706 ; 4.575,2.825 5.05,2.825 ; 4.575,2.944 5.05,2.944 ; 4.575,3.062 5.05,3.062 ; 4.575,3.181 5.05,3.181 ; 4.575,3.3 5.05,3.3 ; 4.575,3.419 5.05,3.419 ; 4.575,3.537 5.05,3.537 ; 4.575,3.656 5.05,3.656 ; 4.575,3.775 5.05,3.775 ; 4.575,3.893 5.05,3.893 ; 4.575,4.012 5.05,4.012 ; 4.575,4.131 5.05,4.131